# Altium integrated library Pedal_MB.IntLib: 83 symbols (continued)
## Jumper_double (continued)
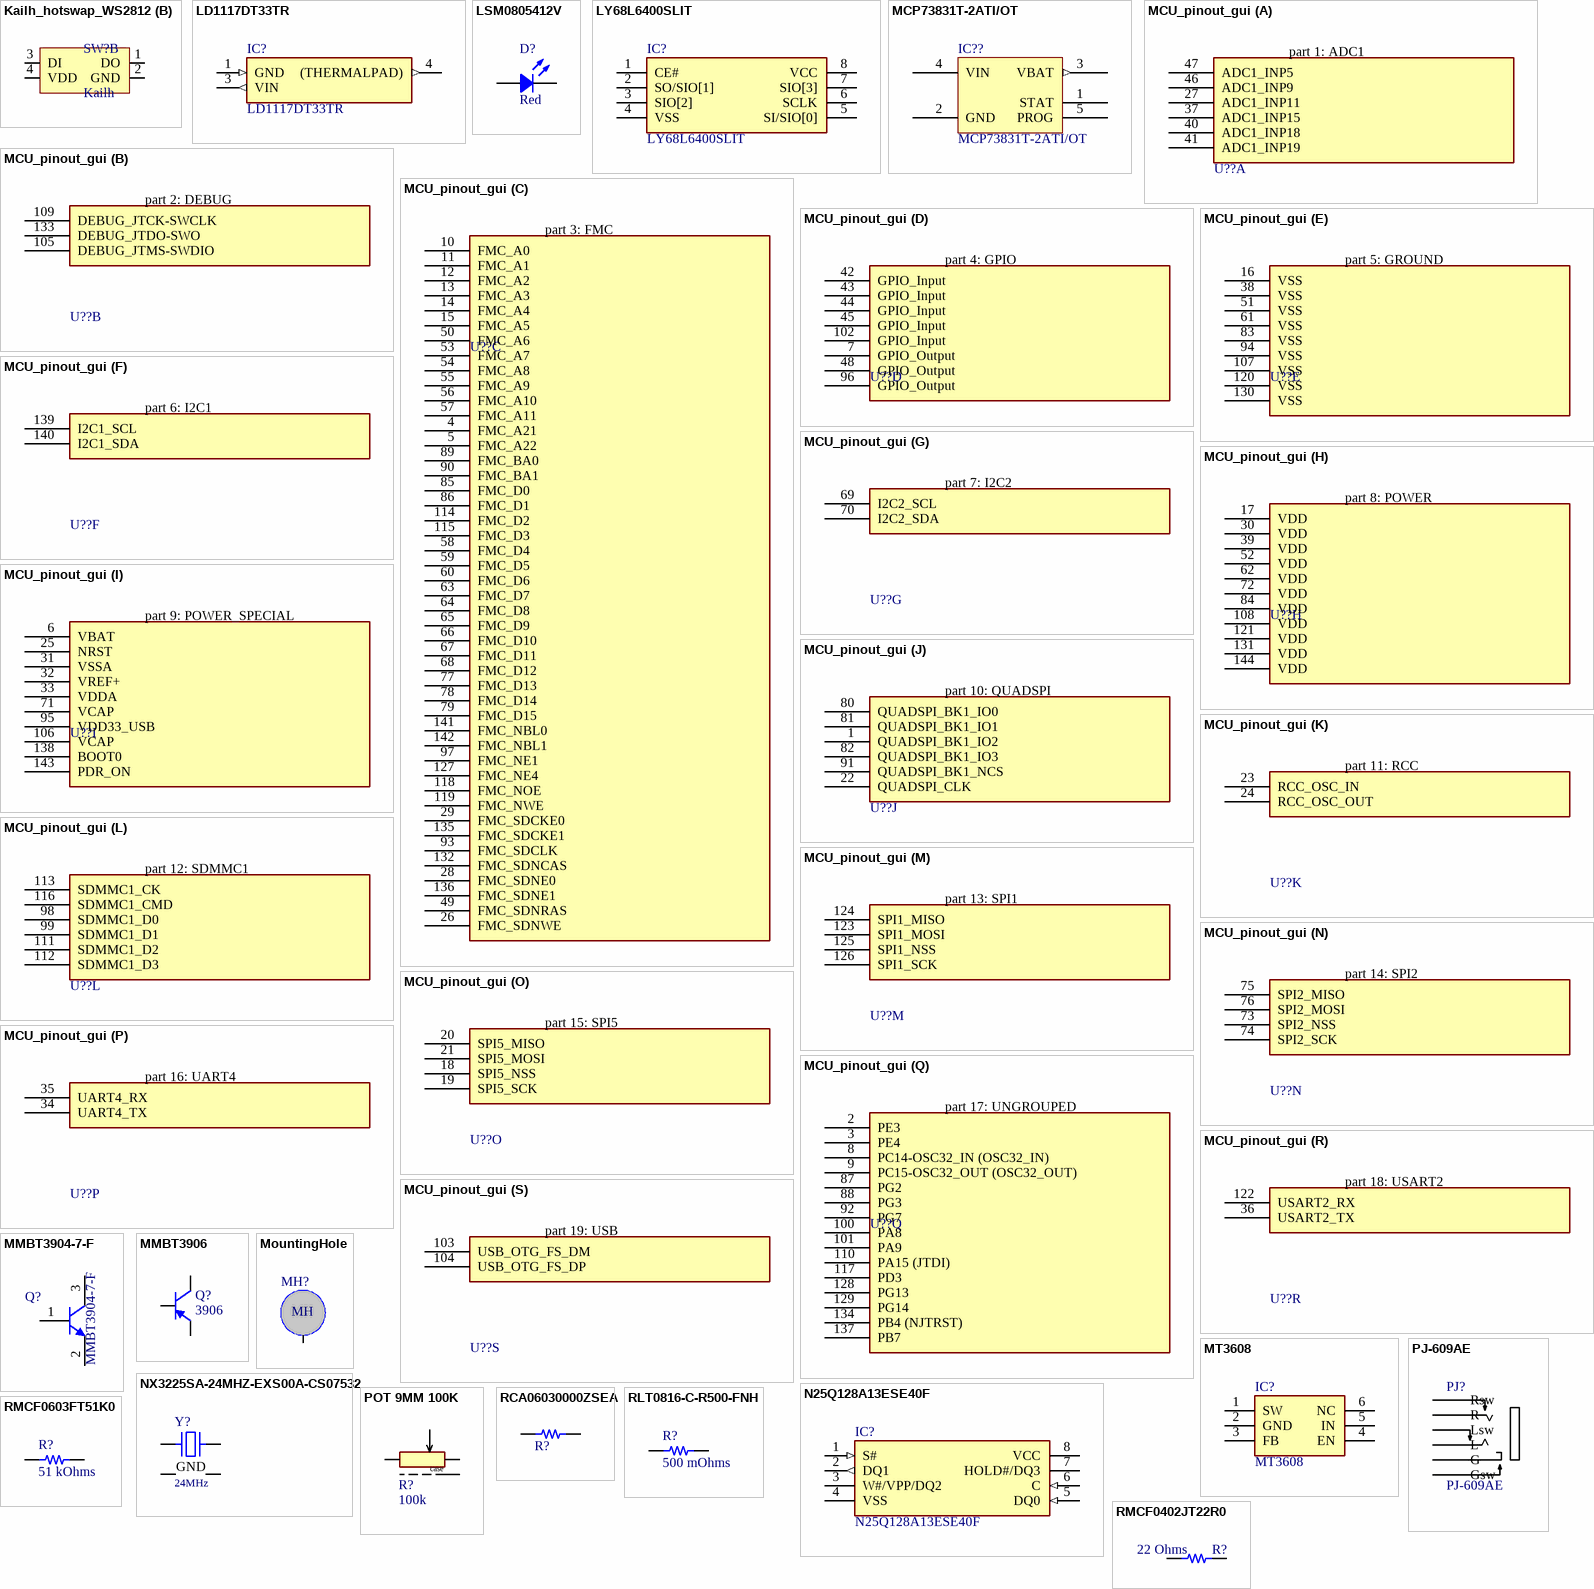
[diagram p1: symbols Kailh_hotswap_WS2812 to RMCF0603FT51K0]

## Kailh_hotswap_WS2812
designator SW?, comment Kailh
Kailh keyboard switch, hotswap rgb, dual-side hotswap options + low prifile variant
footprint KAILH_UNI_MX_WS2812 (Universal footprint for low-profile and regular switches, direct solder. Kailh RGB Black also supported without led, LED is ws2812 in 2020 package)
part A pins: S1 1, S2 2
part B pins: 1 DO, 2 GND, 3 DI, 4 VDD

## LD1117DT33TR
designator IC?
Integrated Circuit; Manufacturer_Name: STMicroelectronics; Datasheet Link: http://www.st.com/web/en/resource/technical/document/datasheet/CD00000544.pdf; Height: 2.4mm; Manufacturer_Part_Number: LD1117DT33TR; Mouser Part Number: 511-LD1117DT33-TR; Mouser Price/Stock: https://www.mouser.co.uk/ProductDetail/STMicroelectronics/LD1117DT33TR?qs=4JhUBQGAOSd4P5jVYGxp2g%3D%3D; Arrow Part Number: LD1117DT33TR; Arrow Price/Stock: https://www.arrow.com/en/products/ld1117dt33tr/stmicroelectronics?region=nac
footprint TO228P972X240-3N
pins: 1 GND (in), 3 VIN (out), 4 (THERMALPAD) (out)

## LSM0805412V
designator D?, comment Red
LED RED CLEAR 0805 SMD; Part Number: LSM0805412V; Manufacturer: Visual Communications Company - VCC; Configuration: 0805; Current - Test: 20mA; Lens Color: Colorless; Lens Size: 1.40mm x 1.20mm; Lens Style: Rectangle with Flat Top; Millicandela Rating: 100mcd; Viewing Angle: 120°; Voltage - Forward (Vf) (Typ): 2V; Wavelength - Dominant: 625nm; Color: Red; ComponentLink1Description: Datasheet; ComponentLink1URL: https://www.vcclite.com/wp-content/uploads/wpallimport/files/files/LSM0805452V-Green-Datasheet.pdf; ComponentLink2Description: DigiKey Link; ComponentLink2URL: https://www.digikey.com/en/products/detail/visual-communications-company-vcc/LSM0805412V/10229616; Device Package: 0805 (2012 Metric); Height (Max): 0.90mm; LastUpdated: 6/3/2024 8:00:06 PM; Lens Transparency: Clear; Lifecycle Status: Active; Minimum Order: 1; Mounting Type: Surface Mount; Package / Case: 0805 (2012 Metric); Packaging: TapeAndReel; PartId: 336; Part Status: Active; Price: 0.11; Series: LSM0805; Size / Dimension: 2.00mm L x 1.25mm W; Supplier 1: DigiKey; Supplier Part Number 1: 28-LSM0805412VCT-ND; Supplier Device Package: 0805; Value: Red; Wavelength - Peak: 625nm
footprint LED 0805_2012 RED
pins: 1, 2

## LY68L6400SLIT
designator IC?
Integrated Circuit; Manufacturer_Name: Lyontek Inc.; Datasheet Link: https://datasheet.lcsc.com/szlcsc/Lyontek-Inc-LY68L6400SLIT_C261881.pdf; Height: 1.75mm; Manufacturer_Part_Number: LY68L6400SLIT
footprint SOIC127P600X175-8N
pins: 1 CE#, 2 SO/SIO[1], 3 SIO[2], 4 VSS, 5 SI/SIO[0], 6 SCLK, 7 SIO[3], 8 VCC

## MCP73831T-2ATI/OT
designator IC??
IC CONTROLLR LI-ION 4.2V SOT23-5; Manufacturer: Microchip Technology; Battery Chemistry: Lithium Ion/Polymer; Charge Current - Max: 500mA; Current - Charging: Constant - Programmable; Fault Protection: Over Voltage; Number of Cells: 1; Programmable Features: Current; Voltage - Supply (Max): 6V; Part Number: MCP73831T-2ATI/OT; Battery Pack Voltage: 4.2V; ComponentLink1Description: Datasheet; ComponentLink1URL: http://ww1.microchip.com/downloads/en/DeviceDoc/20001984g.pdf; ComponentLink2Description: DigiKey Link; ComponentLink2URL: //digikey.com/product-detail/en/microchip-technology/MCP73831T-2ATI-OT/MCP73831T-2ATI-OTTR-ND/964303; Device Package: SC-74A, SOT-753; LastUpdated: 12/3/2019 11:33:03 PM; Lifecycle Status: 0; Minimum Order: 1; Mounting Type: Surface Mount; Operating Temperature: -40°C ~ 85°C (TA); Package / Case: SC-74A, SOT-753; Packaging: TapeAndReel; PartId: 1; Part Status: Active; Price: 0.42; Series: -; Supplier 1: DigiKey; Supplier Part Number 1: MCP73831T-2ATI/OTTR-ND; Supplier Device Package: SOT-23-5
footprint MICROCHIP SOT-23-5 OT
pins: 1 STAT, 2 GND, 3 VBAT (out), 4 VIN, 5 PROG

## MCU_pinout_gui
designator U??  (value not drawn)
MCU with 144 pins / Grouped by function
footprint QFP50P2200X2200X160-144N
part A pins: 27 ADC1_INP11, 37 ADC1_INP15, 40 ADC1_INP18, 41 ADC1_INP19, 46 ADC1_INP9, 47 ADC1_INP5
part B pins: 105 DEBUG_JTMS-SWDIO, 109 DEBUG_JTCK-SWCLK, 133 DEBUG_JTDO-SWO
part C pins: 4 FMC_A21, 5 FMC_A22, 10 FMC_A0, 11 FMC_A1, 12 FMC_A2, 13 FMC_A3, 14 FMC_A4, 15 FMC_A5, 26 FMC_SDNWE, 28 FMC_SDNE0, 29 FMC_SDCKE0, 49 FMC_SDNRAS, 50 FMC_A6, 53 FMC_A7, 54 FMC_A8, 55 FMC_A9, 56 FMC_A10, 57 FMC_A11, 58 FMC_D4, 59 FMC_D5, 60 FMC_D6, 63 FMC_D7, 64 FMC_D8, 65 FMC_D9, 66 FMC_D10, 67 FMC_D11, 68 FMC_D12, 77 FMC_D13, 78 FMC_D14, 79 FMC_D15, 85 FMC_D0, 86 FMC_D1, 89 FMC_BA0, 90 FMC_BA1, 93 FMC_SDCLK, 97 FMC_NE1, 114 FMC_D2, 115 FMC_D3, 118 FMC_NOE, 119 FMC_NWE, 127 FMC_NE4, 132 FMC_SDNCAS, 135 FMC_SDCKE1, 136 FMC_SDNE1, 141 FMC_NBL0, 142 FMC_NBL1
part D pins: 7 GPIO_Output, 42 GPIO_Input, 43 GPIO_Input, 44 GPIO_Input, 45 GPIO_Input, 48 GPIO_Output, 96 GPIO_Output, 102 GPIO_Input
part E pins: 16 VSS, 38 VSS, 51 VSS, 61 VSS, 83 VSS, 94 VSS, 107 VSS, 120 VSS, 130 VSS
part F pins: 139 I2C1_SCL, 140 I2C1_SDA
part G pins: 69 I2C2_SCL, 70 I2C2_SDA
part H pins: 17 VDD, 30 VDD, 39 VDD, 52 VDD, 62 VDD, 72 VDD, 84 VDD, 108 VDD, 121 VDD, 131 VDD, 144 VDD
part I pins: 6 VBAT, 25 NRST, 31 VSSA, 32 VREF+, 33 VDDA, 71 VCAP, 95 VDD33_USB, 106 VCAP, 138 BOOT0, 143 PDR_ON
part J pins: 1 QUADSPI_BK1_IO2, 22 QUADSPI_CLK, 80 QUADSPI_BK1_IO0, 81 QUADSPI_BK1_IO1, 82 QUADSPI_BK1_IO3, 91 QUADSPI_BK1_NCS
part K pins: 23 RCC_OSC_IN, 24 RCC_OSC_OUT
part L pins: 98 SDMMC1_D0, 99 SDMMC1_D1, 111 SDMMC1_D2, 112 SDMMC1_D3, 113 SDMMC1_CK, 116 SDMMC1_CMD
part M pins: 123 SPI1_MOSI, 124 SPI1_MISO, 125 SPI1_NSS, 126 SPI1_SCK
part N pins: 73 SPI2_NSS, 74 SPI2_SCK, 75 SPI2_MISO, 76 SPI2_MOSI
part O pins: 18 SPI5_NSS, 19 SPI5_SCK, 20 SPI5_MISO, 21 SPI5_MOSI
part P pins: 34 UART4_TX, 35 UART4_RX
part Q pins: 2 PE3, 3 PE4, 8 PC14-OSC32_IN (OSC32_IN), 9 PC15-OSC32_OUT (OSC32_OUT), 87 PG2, 88 PG3, 92 PG7, 100 PA8, 101 PA9, 110 PA15 (JTDI), 117 PD3, 128 PG13, 129 PG14, 134 PB4 (NJTRST), 137 PB7
part R pins: 36 USART2_TX, 122 USART2_RX
part S pins: 103 USB_OTG_FS_DM, 104 USB_OTG_FS_DP
part A text: part 1: ADC1
part B text: part 2: DEBUG
part C text: part 3: FMC
part D text: part 4: GPIO
part E text: part 5: GROUND
part F text: part 6: I2C1
part G text: part 7: I2C2
part H text: part 8: POWER
part I text: part 9: POWER_SPECIAL
part J text: part 10: QUADSPI
part K text: part 11: RCC
part L text: part 12: SDMMC1
part M text: part 13: SPI1
part N text: part 14: SPI2
part O text: part 15: SPI5
part P text: part 16: UART4
part Q text: part 17: UNGROUPED
part R text: part 18: USART2
part S text: part 19: USB

## MMBT3904-7-F
designator Q?
TRANS NPN 40V 0.2A SOT23-3; Manufacturer: Diodes Incorporated; Current - Collector Cutoff (Max): 50nA (ICBO); Current - Collector (Ic) (Max): 200 mA; DC Current Gain (hFE) (Min) @ Ic, Vce: 100 @ 10mA, 1V; Frequency - Transition: 300MHz; Power - Max: 300 mW; Vce Saturation (Max) @ Ib, Ic: 300mV @ 5mA, 50mA; Part Number: MMBT3904-7-F; ComponentLink1Description: Datasheet; ComponentLink1URL: https://www.diodes.com/assets/Datasheets/ds30036.pdf; ComponentLink2Description: DigiKey Link; ComponentLink2URL: https://www.digikey.com/en/products/detail/diodes-incorporated/MMBT3904-7-F/814494; LastUpdated: 2/8/2024 9:54:04 PM; Lifecycle Status: Active; Minimum Order: 1; Mounting Type: Surface Mount; Operating Temperature: -55°C ~ 150°C (TJ); Package / Case: TO-236-3, SC-59, SOT-23-3; Packaging: TapeAndReel; PartId: 85; Part Status: Active; Price: 0.01; Series: -; Supplier 1: DigiKey; Supplier Part Number 1: MMBT3904-FDICT-ND; Supplier Device Package: SOT-23-3; Transistor Type: NPN; Voltage - Collector Emitter Breakdown (Max): 40 V
footprint DIODES SOT-23-3
pins: 1 B, 2 E, 3 C

## MMBT3906
designator Q?, comment 3906
footprint SOT-23
pins: 1 B, 2 E, 3 C

## MountingHole
designator MH?  (value not drawn)
footprint Hole_2.5mm
pins: 0
text: MH

## MT3608
designator IC?
Integrated Circuit; Manufacturer_Name: Aerosemi; Datasheet Link: https://www.olimex.com/Products/Breadboarding/BB-PWR-3608/resources/MT3608.pdf; Height: 1.45mm; Manufacturer_Part_Number: MT3608
footprint SOT95P280X145-6N
pins: 1 SW, 2 GND, 3 FB, 4 EN, 5 IN, 6 NC

## N25Q128A13ESE40F
designator IC?
Integrated Circuit; Manufacturer_Name: Micron; Datasheet Link: https://datasheet.datasheetarchive.com/originals/distributors/Datasheets-DGA23/1494983.pdf; Height: 2.16mm; Manufacturer_Part_Number: N25Q128A13ESE40F; Mouser Part Number: 340-182267; Mouser Price/Stock: https://www.mouser.co.uk/ProductDetail/Micron/N25Q128A13ESE40F?qs=taEdVNyAfdHw8xv9Y4zfpQ%3D%3D; Arrow Part Number: N25Q128A13ESE40F; Arrow Price/Stock: https://www.arrow.com/en/products/n25q128a13ese40f/micron-technology
footprint SOIC127P790X216-8N
pins: 1 S# (in), 2 DQ1 (out), 3 W#/VPP/DQ2, 4 VSS (power), 5 DQ0 (in), 6 C (in), 7 HOLD#/DQ3, 8 VCC (power)

## NX3225SA-24MHZ-EXS00A-CS07532
designator Y?, comment 24MHz
CRYSTAL 24MHZ 9PF SMD; Part Number: NX3225SA-24MHZ-EXS00A-CS07532; Manufacturer: NDK America, Inc.; ESR (Equivalent Series Resistance): 100 Ohms; Operating Mode: Fundamental; ComponentLink2Description: DigiKey Link; ComponentLink2URL: http://digikey.com/product-detail/en/ndk-america-inc/NX3225SA-24MHZ-EXS00A-CS07532/644-1393-1-ND/9172121; Frequency: 24MHz; Height - Seated (Max): 0.024" (0.60mm); LastUpdated: 9/2/2020 1:21:59 AM; Lifecycle Status: Active; Load Capacitance: 9pF; Minimum Order: 1; Mounting Type: Surface Mount; Operating Temperature: -40°C ~ 150°C; Package / Case: 4-SMD, No Lead; Packaging: TapeAndReel; PartId: 571; Part Status: Active; Price: 0.38; Ratings: AEC-Q200; Series: NX3225SA; Size / Dimension: 0.126" L x 0.098" W (3.20mm x 2.50mm); Supplier 1: DigiKey; Supplier Part Number 1: 644-1393-1-ND; Type: MHz Crystal; Value: 24MHz
footprint NDK NX3225SA
pins: 1, 2 GND, 3, 4 GND

## PJ-609AE
designator PJ?
6.3mm jack HOOYA
footprint PJ609AE (HOOYA)
pins: 2 G, 3 Gsw, 4 R, 5 Rsw, 6 L, 7 Lsw

## POT 9MM 100K
designator R?, comment 100k
footprint POT
pins: 1, 2, 3, 4
text: case

## RCA06030000ZSEA
designator R?
RES SMD 0 OHM JUMPER 1/10W 0603; Part Number: RCA06030000ZSEA; Manufacturer: Vishay Dale; Power (Watts): 0.1W, 1/10W; ComponentLink1Description: Datasheet; ComponentLink1URL: http://www.vishay.com/docs/20037/rcae3.pdf; ComponentLink2Description: DigiKey Link; ComponentLink2URL: http://digikey.com/product-detail/en/vishay-dale/RCA06030000ZSEA/541-2192-1-ND/4946845; Composition: Thick Film; Device Package: 0603 (1608 Metric); Features: Anti-Sulfur, Automotive AEC-Q200; Height - Seated (Max): 0.020" (0.50mm); LastUpdated: 9/2/2020 1:10:23 AM; Lifecycle Status: Active; Minimum Order: 1; Number of Terminations: 2; Operating Temperature: -55°C ~ 155°C; Package / Case: 0603 (1608 Metric); Packaging: TapeAndReel; PartId: 5740; Part Status: Active; Price: 0.01; Ratings: AEC-Q200; Series: RCA; Size / Dimension: 0.061" L x 0.033" W (1.55mm x 0.85mm); Supplier 1: DigiKey; Supplier Part Number 1: 541-2192-1-ND; Supplier Device Package: 0603; Tolerance: Jumper
footprint RES 0603_1608
pins: 1, 2

## RLT0816-C-R500-FNH
designator R?, comment 500 mOhms
RES 0.5 OHM 1% 1/10W 0603; Part Number: RLT0816-C-R500-FNH; Manufacturer: Delta Electronics/Cyntec; Power (Watts): 0.1W, 1/10W; Temperature Coefficient: ±200ppm/°C; Value: 500 mOhms; ComponentLink2Description: DigiKey Link; ComponentLink2URL: https://www.digikey.com/en/products/detail/delta-electronics-cyntec/RLT0816-C-R500-FNH/9762162; Composition: Thick Film; Device Package: 0603 (1608 Metric); Height - Seated (Max): 0.022" (0.55mm); LastUpdated: 2/9/2024 8:41:44 PM; Lifecycle Status: Active; Minimum Order: 1; Number of Terminations: 2; Operating Temperature: -55°C ~ 125°C; Package / Case: 0603 (1608 Metric); Packaging: TapeAndReel; PartId: 56414; Part Status: Active; Price: 0.11; Resistance: 500 mOhms; Series: RLT0816; Size / Dimension: 0.063" L x 0.031" W (1.60mm x 0.80mm); Supplier 1: DigiKey; Supplier Part Number 1: 2037-RLT0816-C-R500-FNHCT-ND; Supplier Device Package: 0603; Tolerance: ±1%
footprint RES 0603_1608
pins: 1, 2

## RMCF0402JT22R0
designator R?, comment 22 Ohms
RES 22 OHM 5% 1/16W 0402; Part Number: RMCF0402JT22R0; Manufacturer: Stackpole Electronics Inc; Power (Watts): 0.063W, 1/16W; Temperature Coefficient: ±100ppm/°C; Value: 22 Ohms; ComponentLink1Description: Datasheet; ComponentLink1URL: https://www.seielect.com/catalog/sei-rmcf_rmcp.pdf; ComponentLink2Description: DigiKey Link; ComponentLink2URL: https://www.digikey.com/en/products/detail/stackpole-electronics-inc/RMCF0402JT22R0/1758165; Composition: Thick Film; Device Package: 0402 (1005 Metric); Features: Automotive AEC-Q200; Height - Seated (Max): 0.016" (0.40mm); LastUpdated: 2/9/2024 8:30:03 PM; Lifecycle Status: Active; Minimum Order: 1; Number of Terminations: 2; Operating Temperature: -55°C ~ 155°C; Package / Case: 0402 (1005 Metric); Packaging: CutTape; PartId: 7671; Part Status: Active; Price: 0.01; Resistance: 22 Ohms; Series: RMCF; Size / Dimension: 0.039" L x 0.020" W (1.00mm x 0.50mm); Supplier 1: DigiKey; Supplier Part Number 1: RMCF0402JT22R0CT-ND; Supplier Device Package: 0402; Tolerance: ±5%; Ratings: AEC-Q200
footprint RES 0402_1005
pins: 1, 2

## RMCF0603FT51K0
designator R?, comment 51 kOhms
RES 51K OHM 1% 1/10W 0603; Part Number: RMCF0603FT51K0; Manufacturer: Stackpole Electronics Inc; Power (Watts): 0.1W, 1/10W; Temperature Coefficient: ±100ppm/°C; Value: 51 kOhms; ComponentLink1Description: Datasheet; ComponentLink1URL: https://www.seielect.com/catalog/sei-rmcf_rmcp.pdf; ComponentLink2Description: DigiKey Link; ComponentLink2URL: https://www.digikey.com/en/products/detail/stackpole-electronics-inc/RMCF0603FT51K0/1760867; Composition: Thick Film; Device Package: 0603 (1608 Metric); Features: Automotive AEC-Q200; Height - Seated (Max): 0.022" (0.55mm); LastUpdated: 2/9/2024 8:43:14 PM; Lifecycle Status: Active; Minimum Order: 1; Number of Terminations: 2; Operating Temperature: -55°C ~ 155°C; Package / Case: 0603 (1608 Metric); Packaging: CutTape; PartId: 10630; Part Status: Active; Price: 0.01; Resistance: 51 kOhms; Series: RMCF; Size / Dimension: 0.061" L x 0.031" W (1.55mm x 0.80mm); Supplier 1: DigiKey; Supplier Part Number 1: RMCF0603FT51K0CT-ND; Supplier Device Package: 0603; Tolerance: ±1%; Ratings: AEC-Q200
footprint RES 0603_1608
pins: 1, 2

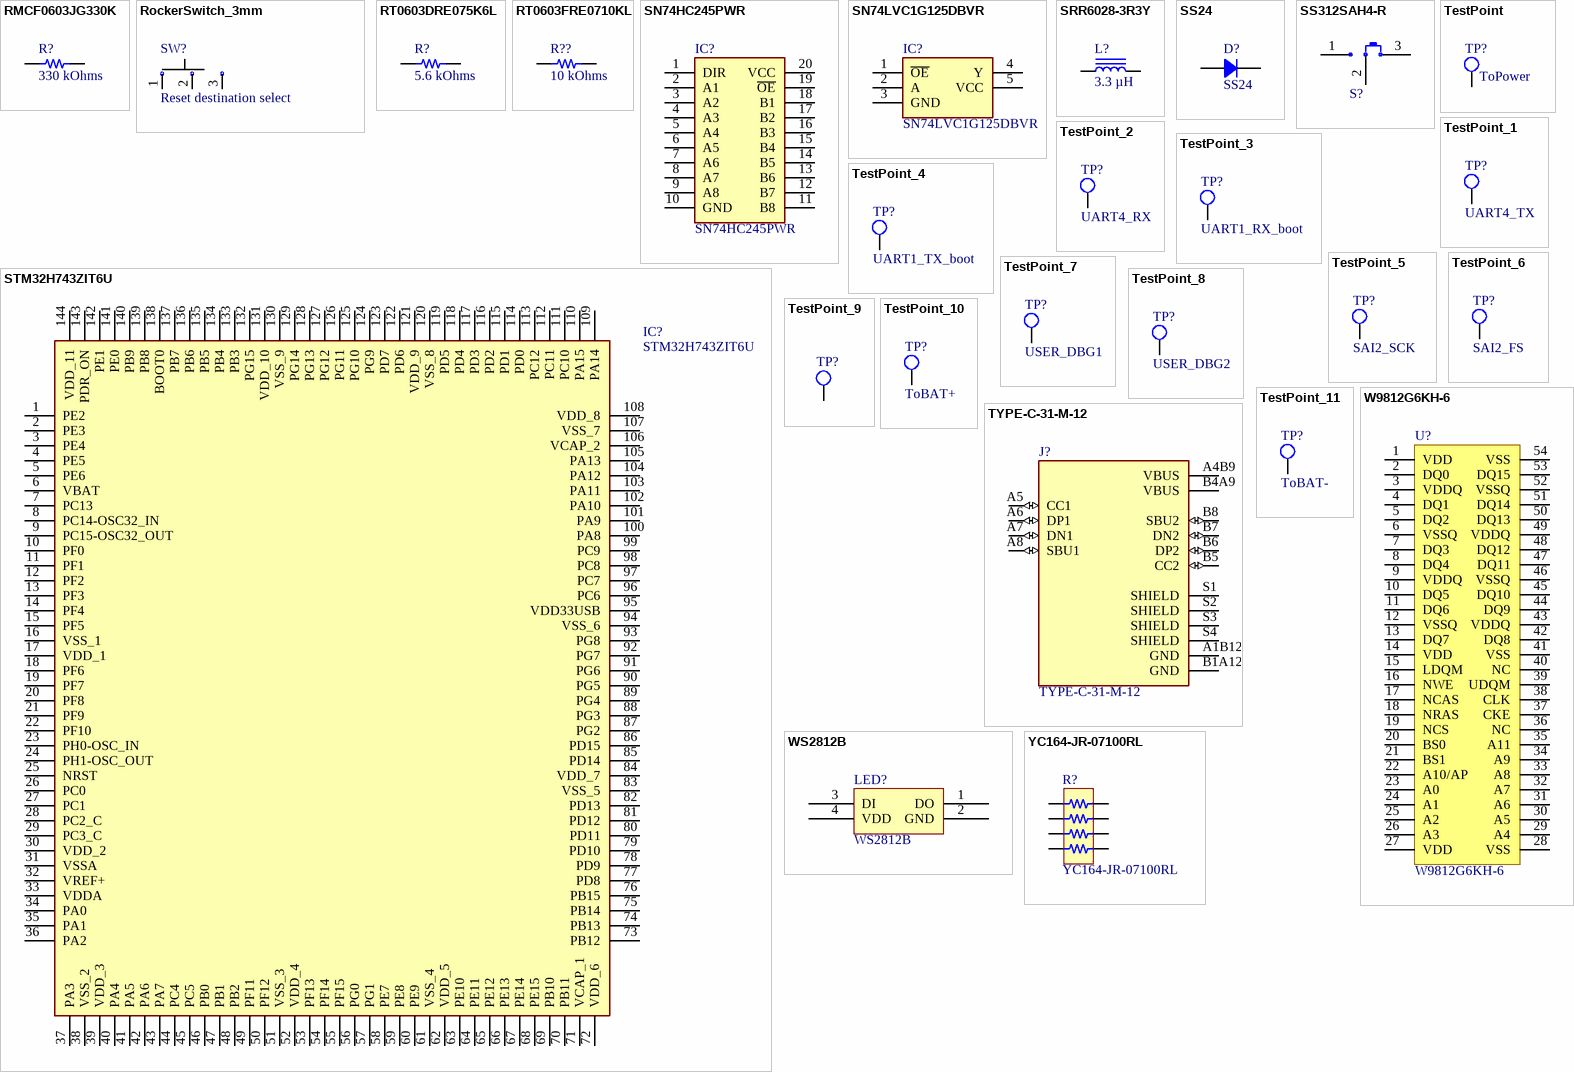
[diagram p2: symbols RMCF0603JG330K to YC164-JR-07100RL]

## RMCF0603JG330K
designator R?, comment 330 kOhms
RES 330K OHM 5% 1/10W 0603; Part Number: RMCF0603JG330K; Manufacturer: Stackpole Electronics Inc; Power (Watts): 0.1W, 1/10W; Temperature Coefficient: ±200ppm/°C; Value: 330 kOhms; ComponentLink1Description: Datasheet; ComponentLink1URL: https://www.seielect.com/catalog/sei-packaging.pdf; ComponentLink2Description: DigiKey Link; ComponentLink2URL: https://www.digikey.com/en/products/detail/stackpole-electronics-inc/RMCF0603JG330K/6053782; Composition: Thick Film; Device Package: 0603 (1608 Metric); Features: Automotive AEC-Q200; Height - Seated (Max): 0.022" (0.55mm); LastUpdated: 2/9/2024 8:42:36 PM; Lifecycle Status: Active; Minimum Order: 1; Number of Terminations: 2; Operating Temperature: -55°C ~ 155°C; Package / Case: 0603 (1608 Metric); Packaging: CutTape; PartId: 20312; Part Status: Active; Price: 0.01; Ratings: AEC-Q200; Resistance: 330 kOhms; Series: RMCF; Size / Dimension: 0.061" L x 0.031" W (1.55mm x 0.80mm); Supplier 1: DigiKey; Supplier Part Number 1: RMCF0603JG330KCT-ND; Supplier Device Package: 0603; Tolerance: ±5%
footprint RES 0603_1608
pins: 1, 2

## RockerSwitch_3mm
designator SW?, comment Reset destination select
Slide switch L-KLS7-SS-12F19-G5
footprint SLIDE_SW_BIG (My slide switch from chip dip)
pins: 1, 2, 3

## RT0603DRE075K6L
designator R?, comment 5.6 kOhms
RES SMD 5.6K OHM 0.5% 1/10W 0603; Part Number: RT0603DRE075K6L; Manufacturer: Yageo; Power (Watts): 0.1W, 1/10W; Temperature Coefficient: ±50ppm/°C; Value: 5.6 kOhms; ComponentLink1Description: Datasheet; ComponentLink1URL: https://www.yageo.com/upload/media/product/productsearch/datasheet/rchip/PYu-RT_1-to-0.01_RoHS_L_11.pdf; ComponentLink2Description: DigiKey Link; ComponentLink2URL: http://digikey.com/product-detail/en/yageo/RT0603DRE075K6L/311-2635-1-ND/6129054; Composition: Thin Film; Device Package: 0603 (1608 Metric); Height - Seated (Max): 0.022" (0.55mm); LastUpdated: 9/2/2020 1:10:05 AM; Lifecycle Status: Active; Minimum Order: 1; Number of Terminations: 2; Operating Temperature: -55°C ~ 155°C; Package / Case: 0603 (1608 Metric); Packaging: TapeAndReel; PartId: 14197; Part Status: Active; Price: 0.01; Resistance: 5.6 kOhms; Series: RT; Size / Dimension: 0.063" L x 0.031" W (1.60mm x 0.80mm); Supplier 1: DigiKey; Supplier Part Number 1: 311-2635-1-ND; Supplier Device Package: 0603; Tolerance: ±0.5%
footprint RES 0603_1608
pins: 1, 2

## RT0603FRE0710KL
designator R??, comment 10 kOhms
RES SMD 10K OHM 1% 1/10W 0603; Part Number: RT0603FRE0710KL; Manufacturer: Yageo; Power (Watts): 0.1W, 1/10W; Temperature Coefficient: ±50ppm/°C; Value: 10 kOhms; ComponentLink1Description: Datasheet; ComponentLink1URL: https://www.yageo.com/upload/media/product/productsearch/datasheet/rchip/PYu-RT_1-to-0.01_RoHS_L_11.pdf; ComponentLink2Description: DigiKey Link; ComponentLink2URL: http://digikey.com/product-detail/en/yageo/RT0603FRE0710KL/YAG2321CT-ND/5252435; Composition: Thin Film; Device Package: 0603 (1608 Metric); Height - Seated (Max): 0.022" (0.55mm); LastUpdated: 9/2/2020 1:10:23 AM; Lifecycle Status: Active; Minimum Order: 1; Number of Terminations: 2; Operating Temperature: -55°C ~ 155°C; Package / Case: 0603 (1608 Metric); Packaging: TapeAndReel; PartId: 5671; Part Status: Active; Price: 0.01; Resistance: 10 kOhms; Series: RT; Size / Dimension: 0.063" L x 0.031" W (1.60mm x 0.80mm); Supplier 1: DigiKey; Supplier Part Number 1: YAG2321CT-ND; Supplier Device Package: 0603; Tolerance: ±1%
footprint RES 0603_1608
pins: 1, 2

## SN74HC245PWR
designator IC?
Integrated Circuit; Manufacturer_Name: Texas Instruments; Datasheet Link: http://www.ti.com/lit/gpn/sn74hc245; Height: 1.2mm; Manufacturer_Part_Number: SN74HC245PWR; Mouser Part Number: 595-SN74HC245PWR; Mouser Price/Stock: https://www.mouser.co.uk/ProductDetail/Texas-Instruments/SN74HC245PWR?qs=JS6RUWRH9DXHcWNikQOotA%3D%3D; Arrow Part Number: SN74HC245PWR; Arrow Price/Stock: https://www.arrow.com/en/products/sn74hc245pwr/texas-instruments?region=nac
footprint SOP65P640X120-20N
pins: 1 DIR, 2 A1, 3 A2, 4 A3, 5 A4, 6 A5, 7 A6, 8 A7, 9 A8, 10 GND, 11 B8, 12 B7, 13 B6, 14 B5, 15 B4, 16 B3, 17 B2, 18 B1, 19 ~{OE}, 20 VCC

## SN74LVC1G125DBVR
designator IC?
Integrated Circuit; Manufacturer_Name: Texas Instruments; Datasheet Link: http://www.ti.com/lit/ds/symlink/sn74lvc1g125.pdf; Height: 1.45mm; Manufacturer_Part_Number: SN74LVC1G125DBVR; Mouser Part Number: 595-SN74LVC1G125DBVR; Mouser Price/Stock: https://www.mouser.co.uk/ProductDetail/Texas-Instruments/SN74LVC1G125DBVR?qs=dT9u2OTAaVWCjkJK89JQQg%3D%3D; Arrow Part Number: SN74LVC1G125DBVR; Arrow Price/Stock: https://www.arrow.com/en/products/sn74lvc1g125dbvr/texas-instruments?region=nac
footprint SOT95P280X145-5N
pins: 1 ~{OE}, 2 A, 3 GND, 4 Y, 5 VCC

## SRR6028-3R3Y
designator L?, comment 3.3 µH
FIXED IND 3.3UH 2.5A 28 MOHM SMD; Part Number: SRR6028-3R3Y; Manufacturer: Bourns Inc.; Current - Saturation: 2.6A; DC Resistance (DCR): 28mOhm Max; Frequency - Self Resonant: 45MHz; Inductance Frequency - Test: 100 kHz; Material - Core: Ferrite; Q @ Freq: 10 @ 7.96MHz; Shielding: Shielded; Tolerance: ±30%; Type: Drum Core, Wirewound; ComponentLink1Description: Datasheet; ComponentLink1URL: https://www.bourns.com/docs/Product-Datasheets/SRR6028.pdf; ComponentLink2Description: DigiKey Link; ComponentLink2URL: https://www.digikey.com/en/products/detail/bourns-inc/SRR6028-3R3Y/1970369; Current Rating (Amps): 2.5 A; Device Package: Nonstandard; Height - Seated (Max): 0.118" (3.00mm); Inductance: 3.3 µH; LastUpdated: 2/8/2024 9:34:55 PM; Lifecycle Status: Active; Minimum Order: 1; Mounting Type: Surface Mount; Operating Temperature: -40°C ~ 125°C; Package / Case: Nonstandard; Packaging: TapeAndReel; PartId: 57; Part Status: Active; Price: 0.31; Series: SRR6028; Size / Dimension: 0.268" L x 0.268" W (6.80mm x 6.80mm); Supplier 1: DigiKey; Supplier Part Number 1: 118-SRR6028-3R3YCT-ND; Value: 3.3 µH
footprint BOURNS SRR6028
pins: 1, 2

## SS24
designator D?
DIODE SCHOTTKY 40V 2A DO214AA; Manufacturer: ON Semiconductor; Current - Reverse Leakage @ Vr: 400µA @ 40V; Speed: Fast Recovery =< 500ns, > 200mA (Io); Voltage - Forward (Vf) (Max) @ If: 500mV @ 2A; Part Number: SS24; ComponentLink1Description: Datasheet; ComponentLink1URL: https://www.onsemi.com/pub/Collateral/SS29-D.pdf; ComponentLink2Description: DigiKey Link; ComponentLink2URL: http://digikey.com/product-detail/en/on-semiconductor/SS24/SS24FSCT-ND/1626273; Current - Average Rectified (Io): 2A; Diode Type: Schottky; LastUpdated: 2/8/2024 9:26:46 PM; Lifecycle Status: Active; Minimum Order: 1; Mounting Type: Surface Mount; Operating Temperature - Junction: -65°C ~ 125°C; Package / Case: DO-214AA, SMB; Packaging: TapeAndReel; PartId: 1394; Part Status: Active; Price: 0.10; Series: -; Supplier 1: DigiKey; Supplier Part Number 1: SS24FSCT-ND; Supplier Device Package: DO-214AA (SMB); Voltage - DC Reverse (Vr) (Max): 40V
footprint DO214AA SMB
pins: 1, 2

## SS312SAH4-R
designator S?  (value not drawn)
SWITCH SLIDE SPDT 0.4VA 28V; Manufacturer: NKK Switches; Actuator Length: 2.00mm; Actuator Type: Standard; Contact Timing: Shorting (MBB); Current Rating (Amps): 0.4VA (AC/DC); Switch Function: On-On; Part Number: SS312SAH4-R; Circuit: SPDT; ComponentLink1Description: Datasheet; ComponentLink1URL: http://www.nkkswitches.com/pdf/SS3surfaceMount-1.pdf; ComponentLink2Description: DigiKey Link; ComponentLink2URL: http://digikey.com/product-detail/en/nkk-switches/SS312SAH4-R/360-2924-1-ND/1051215; Contact Finish: Gold; Contact Material: Phosphor Bronze; LastUpdated: 1/4/2020 7:10:14 PM; Lifecycle Status: Active; Minimum Order: 1; Mounting Type: Surface Mount, Right Angle; Operating Temperature: -25°C ~ 85°C; Packaging: TapeAndReel; PartId: 1; Part Status: Active; Price: 1.95; Series: SS3; Supplier 1: DigiKey; Supplier Part Number 1: 360-2924-1-ND; Termination Style: Gull Wing; Voltage Rating - AC: 28V; Voltage Rating - DC: 28V
footprint NKK SS312SAH4
pins: 1, 2 COM, 3

## STM32H743ZIT6U
designator IC?
Integrated Circuit; Manufacturer_Name: STMicroelectronics; Datasheet Link: https://componentsearchengine.com/Datasheets/1/STM32H743ZIT6U.pdf; Height: 1.6mm; Manufacturer_Part_Number: STM32H743ZIT6U; Mouser Part Number: N/A; Mouser Price/Stock: https://www.mouser.co.uk/ProductDetail/STMicroelectronics/STM32H743ZIT6U?qs=PzGy0jfpSMtTUBlZwwPqMQ%3D%3D
footprint QFP50P2200X2200X160-144N
pins: 1 PE2, 2 PE3, 3 PE4, 4 PE5, 5 PE6, 6 VBAT, 7 PC13, 8 PC14-OSC32_IN, 9 PC15-OSC32_OUT, 10 PF0, 11 PF1, 12 PF2, 13 PF3, 14 PF4, 15 PF5, 16 VSS_1, 17 VDD_1, 18 PF6, 19 PF7, 20 PF8, 21 PF9, 22 PF10, 23 PH0-OSC_IN, 24 PH1-OSC_OUT, 25 NRST, 26 PC0, 27 PC1, 28 PC2_C, 29 PC3_C, 30 VDD_2, 31 VSSA, 32 VREF+, 33 VDDA, 34 PA0, 35 PA1, 36 PA2, 37 PA3, 38 VSS_2, 39 VDD_3, 40 PA4, 41 PA5, 42 PA6, 43 PA7, 44 PC4, 45 PC5, 46 PB0, 47 PB1, 48 PB2, 49 PF11, 50 PF12, 51 VSS_3, 52 VDD_4, 53 PF13, 54 PF14, 55 PF15, 56 PG0, 57 PG1, 58 PE7, 59 PE8, 60 PE9, 61 VSS_4, 62 VDD_5, 63 PE10, 64 PE11, 65 PE12, 66 PE13, 67 PE14, 68 PE15, 69 PB10, 70 PB11, 71 VCAP_1, 72 VDD_6, 73 PB12, 74 PB13, 75 PB14, 76 PB15, 77 PD8, 78 PD9, 79 PD10, 80 PD11, 81 PD12, 82 PD13, 83 VSS_5, 84 VDD_7, 85 PD14, 86 PD15, 87 PG2, 88 PG3, 89 PG4, 90 PG5, 91 PG6, 92 PG7, 93 PG8, 94 VSS_6, 95 VDD33USB, 96 PC6, 97 PC7, 98 PC8, 99 PC9, 100 PA8, 101 PA9, 102 PA10, 103 PA11, 104 PA12, 105 PA13, 106 VCAP_2, 107 VSS_7, 108 VDD_8, 109 PA14, 110 PA15, 111 PC10, 112 PC11, 113 PC12, 114 PD0, 115 PD1, 116 PD2, 117 PD3, 118 PD4, 119 PD5, 120 VSS_8, 121 VDD_9, 122 PD6, 123 PD7, 124 PG9, 125 PG10, 126 PG11, 127 PG12, 128 PG13, 129 PG14, 130 VSS_9, 131 VDD_10, 132 PG15, 133 PB3, 134 PB4, 135 PB5, 136 PB6, 137 PB7, 138 BOOT0, 139 PB8, 140 PB9, 141 PE0, 142 PE1, 143 PDR_ON, 144 VDD_11

## TestPoint
designator TP?, comment ToPower
footprint TESTPOINT
footprint TESTPOINT_VIA
footprint TESTPOINT_PAD
pins: 1 12

## TestPoint_1
designator TP?, comment UART4_TX
footprint TESTPOINT
footprint TESTPOINT_VIA
footprint TESTPOINT_PAD
pins: 1 12

## TestPoint_2
designator TP?, comment UART4_RX
footprint TESTPOINT
footprint TESTPOINT_VIA
footprint TESTPOINT_PAD
pins: 1 12

## TestPoint_3
designator TP?, comment UART1_RX_boot
footprint TESTPOINT
footprint TESTPOINT_VIA
footprint TESTPOINT_PAD
pins: 1 12

## TestPoint_4
designator TP?, comment UART1_TX_boot
footprint TESTPOINT
footprint TESTPOINT_VIA
footprint TESTPOINT_PAD
pins: 1 12

## TestPoint_5
designator TP?, comment SAI2_SCK
footprint TESTPOINT
footprint TESTPOINT_VIA
footprint TESTPOINT_PAD
pins: 1 12

## TestPoint_6
designator TP?, comment SAI2_FS
footprint TESTPOINT
footprint TESTPOINT_VIA
footprint TESTPOINT_PAD
pins: 1 12

## TestPoint_7
designator TP?, comment USER_DBG1
footprint TESTPOINT
footprint TESTPOINT_VIA
footprint TESTPOINT_PAD
pins: 1 12

## TestPoint_8
designator TP?, comment USER_DBG2
footprint TESTPOINT
footprint TESTPOINT_VIA
footprint TESTPOINT_PAD
pins: 1 12

## TestPoint_9
designator TP?
footprint TESTPOINT
footprint TESTPOINT_VIA
footprint TESTPOINT_PAD
pins: 1 12

## TestPoint_10
designator TP?, comment ToBAT+
footprint TESTPOINT
footprint TESTPOINT_VIA
footprint TESTPOINT_PAD
pins: 1 12

## TestPoint_11
designator TP?, comment ToBAT-
footprint TESTPOINT
footprint TESTPOINT_VIA
footprint TESTPOINT_PAD
pins: 1 12

## TYPE-C-31-M-12
designator J?
USB Connectors 24 Receptacle 1 8.94*7.3mm RoHS; MF: {'manufacturer': u'HRO Electronics Co., Ltd.'}; Package: None; Price: None; Value: *; MP: TYPE-C-31-M-12; Availability: Unavailable
footprint HRO_TYPE-C-31-M-12
footprint HRO_TYPE-C-31-M-12 - REZONIT
pins: A1B12 GND (power), A4B9 VBUS (power), A5 CC1 (io), A6 DP1 (io), A7 DN1 (io), A8 SBU1 (io), B1A12 GND (power), B4A9 VBUS (power), B5 CC2 (io), B6 DP2 (io), B7 DN2 (io), B8 SBU2 (io), S1 SHIELD, S2 SHIELD, S3 SHIELD, S4 SHIELD

## W9812G6KH-6
designator U?
footprint TSOP-54
pins: 1 VDD, 2 DQ0, 3 VDDQ, 4 DQ1, 5 DQ2, 6 VSSQ, 7 DQ3, 8 DQ4, 9 VDDQ, 10 DQ5, 11 DQ6, 12 VSSQ, 13 DQ7, 14 VDD, 15 LDQM, 16 NWE, 17 NCAS, 18 NRAS, 19 NCS, 20 BS0, 21 BS1, 22 A10/AP, 23 A0, 24 A1, 25 A2, 26 A3, 27 VDD, 28 VSS, 29 A4, 30 A5, 31 A6, 32 A7, 33 A8, 34 A9, 35 A11, 36 NC, 37 CKE, 38 CLK, 39 UDQM, 40 NC, 41 VSS, 42 DQ8, 43 VDDQ, 44 DQ9, 45 DQ10, 46 VSSQ, 47 DQ11, 48 DQ12, 49 VDDQ, 50 DQ13, 51 DQ14, 52 VSSQ, 53 DQ15, 54 VSS

## WS2812B
designator LED?
Address LED
footprint WS2812B_5050
footprint WS2812B_2.2x2mm
pins: 1 DO, 2 GND, 3 DI, 4 VDD

## YC164-JR-07100RL
designator R?
RES ARRAY 4 RES 100 OHM 1206; Manufacturer: Yageo; Circuit Type: Isolated; Number of Resistors: 4; Power Per Element: 62.5mW; Resistance (Ohms): 100; Temperature Coefficient: ±200ppm/°C; Tolerance: ±5%; Part Number: YC164-JR-07100RL; Applications: DDRAM, SDRAM; ComponentLink1Description: Datasheet; ComponentLink1URL: https://www.yageo.com/upload/media/product/productsearch/datasheet/rchip/PYu-YC_TC_group_51_RoHS_L_9.pdf; ComponentLink2Description: DigiKey Link; ComponentLink2URL: http://digikey.com/product-detail/en/yageo/YC164-JR-07100RL/YC164J-100CT-ND/1005656; Height - Seated (Max): 0.028" (0.70mm); LastUpdated: 9/2/2020 1:23:24 AM; Lifecycle Status: Active; Minimum Order: 1; Mounting Type: Surface Mount; Number of Pins: 8; Operating Temperature: -55°C ~ 155°C; Package / Case: 1206 (3216 Metric), Convex, Long Side Terminals; Packaging: TapeAndReel; PartId: 239; Part Status: Active; Price: 0.01; Series: YC164; Size / Dimension: 0.126" L x 0.063" W (3.20mm x 1.60mm); Supplier 1: DigiKey; Supplier Part Number 1: YC164J-100CT-ND
footprint RESNET 1206-8 CONVEX
pins: 1, 2, 3, 4, 5, 6, 7, 8